# Altium footprint library LimeNet-Micro_2v1.PcbLib: 86 footprints (part 2 of 6)
Each footprint in its own frame and in the unit in brackets; x right, y up, seen from the top. Pads: shape width x height; smd on the part's side, far side on the other; paste and mask are expansions set on the pad; w line width, h text height; cw(c..) or ccw(c..) is an arc to the next point about the centre after c.
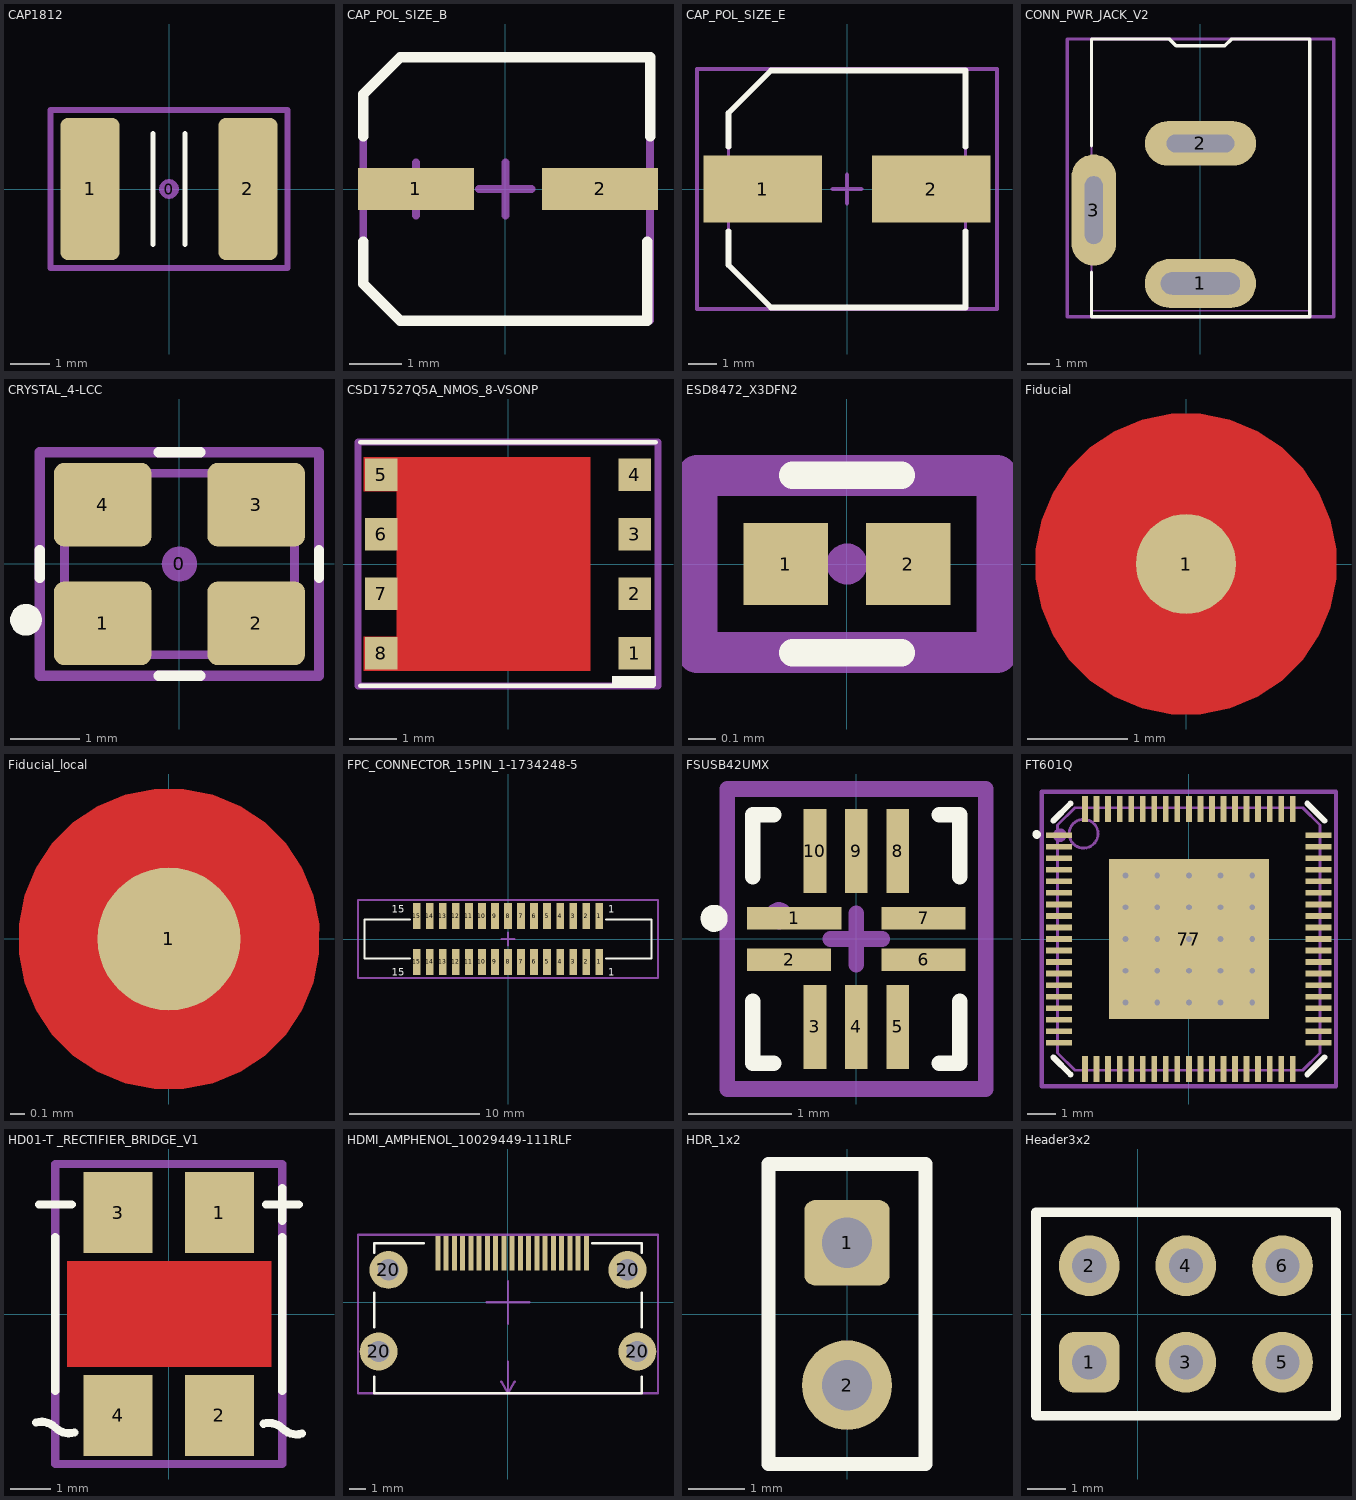
[diagram p1: the footprints below, top view; thin cyan lines are the x and y axes]

## CAP1812 [mm]
pads (3):
  round 0.508 on Mech15: 0(0,0)
  rrect25% 1.5x3.6 smd: 1(-2,0) 2(2,0)
Top Overlay:
  lines w0.127: -0.4,-1.4 -0.4,1.4 ; 0.4,-1.4 0.4,1.4
Mechanical 15:
  lines w0.15: -3,-2 -3,2 3,2 3,-2 -3,-2
  text ".Designator" at -0.65,0.6 h0.55
3D body "C1812C102KGRACTU.step": height 1.54, standoff -0.01, extent -2.4,-1.7 2.4,1.8

## CAP_POL_SIZE_B [mm]
pads (2):
  rect 2.2x0.8 smd: 1(-1.7,0) 2(1.8,0)
Top Overlay:
  lines w0.2: -2.7,-1 -2.7,-1.8 -2,-2.5 2.7,-2.5 2.7,-1 ; -2.7,1 -2.7,1.8 -2,2.5 2.75,2.5 2.75,1
Mechanical 15:
  lines w0.15: -2.2,0 -1.2,0 ; -1.7,-0.5 -1.7,0.5 ; -0.5,0 0.5,0 ; 0,-0.5 0,0.5 ; -2.7,-1.8 -2.7,1.8 -2,2.5 2.75,2.5 2.75,-2.5 -2,-2.5 -2.7,-1.8
  text ".Designator" at -0.741,0.85 h0.55
3D body "猞4 SIZE CODE B.stp": height 5.8, standoff 0, extent -2.5,-2.15 2.5,2.15

## CAP_POL_SIZE_E [mm]
pads (2):
  rect 4.15x2.35 smd: 1(-2.95,0) 2(2.95,0)
Top Overlay:
  lines w0.2: -4.15,-1.475 -4.15,-2.663 -2.663,-4.15 4.15,-4.15 4.15,-1.475 ; -4.15,1.475 -4.15,2.663 -2.663,4.15 4.15,4.15 4.15,1.475
Mechanical 13:
  lines w0.1: -4.15,-2.663 -2.663,-4.15 4.15,-4.15 4.15,4.15 -2.663,4.15 -4.15,2.663 -4.15,-2.663
Mechanical 15:
  lines w0.1: -4.9,0 -3.4,0 ; -4.15,-0.75 -4.15,0.75
  lines w0.15: -0.5,0 0.5,0 ; 0,-0.5 0,0.5 ; -5.25,-4.2 -5.25,4.2 5.25,4.2 5.25,-4.2 -5.25,-4.2
  text ".Designator" at 1.825,-0.98 h0.55
3D body "User Library-capacitor size E.step": height 6.2, standoff -0.01, extent -4.5,-4.15 4.5,4.15

## CONN_PWR_JACK_V2 [mm]
pads (3):
  oval 5x2.2 hole 1 slot 3.56 at 0 deg: 1(0,-14)
  oval 5x2 hole 0.8 slot 3.05 at 0 deg: 2(0,-7.7)
  oval 2x5 hole 0.8 slot 3.05 at 90 deg: 3(-4.8,-10.7)
Top Overlay:
  lines w0.15: -4.9,-13.5 -4.9,-15.5 4.925,-15.5 4.925,-3 1.4,-3 1.1,-3.3 -1.1,-3.3 -1.4,-3 -4.9,-3 -4.9,-7.8
Mechanical 13:
  lines w0.076: -4.9,-12.4 -4.9,-15.225 4.925,-15.225 4.925,-3 1.4,-3 1.1,-3.3 -1.1,-3.3 -1.4,-3 -4.9,-3 -4.9,-9
Mechanical 15:
  lines w0.15: -6,-15.5 -6,-3 6,-3 6,-15.5 -6,-15.5
  text ".Designator" at -0.175,-9.625 h0.55
3D body "3100-522 Connector.stp": height 11, standoff -3.5, extent -4.9,-14.1 4.5,0

## CRYSTAL_4-LCC [mm]
pads (5):
  round 0.508 on Mech15: 0(0,0)
  rrect25% 1.4x1.2 smd: 1(-1.1,-0.85) 2(1.1,-0.85) 3(1.1,0.85) 4(-1.1,0.85)
Top Overlay:
  circle w0.254: c-2.2,-0.8 r0.1
  lines w0.15: -2,-0.2 -2,0.2 ; -0.3,-1.6 0.3,-1.6 ; -0.3,1.6 0.3,1.6 ; 2,-0.2 2,0.2
Mechanical 13:
  lines w0.127: -1.65,-1.143 -1.493,-1.3 1.493,-1.3 1.65,-1.143 1.65,1.144 1.494,1.3 -1.493,1.3 -1.65,1.143 -1.65,-1.143
Mechanical 15:
  circle w0.35: c-1.4,-1.1 r0.141
  lines w0.15: -2,-1.6 2,-1.6 2,1.6 -2,1.6 -2,-1.6
  text ".Designator" at 0.7,1.125 h0.55
3D body "Crystal TXC Corp 7M series.STEP": height 0.8, standoff 0, extent -1.65,-1.3 1.65,1.3

## CSD17527Q5A_NMOS_8-VSONP [mm]
pads (8):
  rect 0.7x0.7 smd: 1(2.705,-1.905) 2(2.705,-0.635) 3(2.705,0.635) 4(2.705,1.905) 5(-2.705,1.905) 6(-2.705,0.635) 7(-2.705,-0.635) 8(-2.705,-1.905)
Top Layer:
  region: -3.075,-1.55 -2.375,-1.55 -2.375,1.55 -3.075,1.55 -3.075,2.275 1.75,2.275 1.75,-2.275 -3.075,-2.275
Top Overlay:
  region: 3.15,-2.6 3.15,-2.4 2.225,-2.4 2.225,-2.6
  lines w0.1: -3.15,-2.6 3.1,-2.6 ; -3.15,2.6 3.15,2.6
Top Paste:
  region: -1.8,1.775 -1.8,0.275 -0.3,0.275 -0.3,1.775
  region: -1.8,-1.775 -1.8,-0.275 -0.3,-0.275 -0.3,-1.775
  region: 0.1,1.775 1.3,1.775 1.3,0.275 0.1,0.275
  region: 0.1,-1.775 1.3,-1.775 1.3,-0.275 0.1,-0.275
Top Solder:
  region: 1.85,-2.35 1.85,2.35 -2.45,2.35 -2.45,-2.35
Mechanical 15:
  circle w0.15: c2.7,-1.9 r0.1
  lines w0.15: -0.5,0 0.5,0 ; 0,-0.5 0,0.5 ; -3.2,-2.6 -3.2,2.6 3.2,2.6 3.2,-2.6 -3.2,-2.6
  text ".Designator" at 0.73,1.345 h0.55
3D body "User Library-VSON-8.step": height 1, standoff 0, extent -3.002,-2.5 3,2.5

## ESD8472_X3DFN2 [mm]
pads (2):
  rect 0.31x0.3 smd mask+0.05: 1(-0.225,0) 2(0.225,0)
Top Overlay:
  lines w0.1: -0.2,-0.325 0.2,-0.325 ; -0.2,0.325 0.2,0.325
Top Solder:
  region: -0.4,0.2 -0.4,-0.2 0.4,-0.2 0.4,0.2
Mechanical 15:
  circle w0.1: c0,0 r0.025
  lines w0.15: -0.55,-0.325 0.55,-0.325 0.55,0.325 -0.55,0.325 -0.55,-0.325
  text ".Designator" at -0.9,0.225 h0.55

## Fiducial [mm]
pads (1):
  round 1 smd paste-1 mask+1: 1(0,0)
Top Layer:
  pour cut-out: 0,1.5 -0.148,1.5 -0.438,1.442 -0.711,1.329 -0.956,1.165 -1.165,0.956 -1.329,0.711 -1.442,0.438 -1.5,0.148 -1.5,0 -1.5,-0.148 -1.442,-0.438 -1.329,-0.711 -1.165,-0.956 -0.956,-1.165 -0.711,-1.329 -0.438,-1.442 -0.148,-1.5 0,-1.5 0.148,-1.5 0.438,-1.442 0.711,-1.329 0.956,-1.165 1.165,-0.956 1.329,-0.711 1.442,-0.438 1.5,-0.148 1.5,0 1.5,0.148 1.442,0.438 1.329,0.711 1.165,0.956 0.956,1.165 0.711,1.329 0.438,1.442 0.148,1.5
Mechanical 1:
  circle w0.6: c0,0 r0.2

## Fiducial_local [mm]
pads (1):
  round 1 smd paste-1 mask+0.5: 1(0,0)
Top Layer:
  pour cut-out: -1.05,0 -1.05,-0.103 -1.01,-0.306 -0.931,-0.497 -0.816,-0.669 -0.669,-0.816 -0.497,-0.931 -0.306,-1.01 -0.103,-1.05 0,-1.05 0.103,-1.05 0.306,-1.01 0.497,-0.931 0.669,-0.816 0.816,-0.669 0.931,-0.497 1.01,-0.306 1.05,-0.103 1.05,0 1.05,0.103 1.01,0.306 0.931,0.497 0.816,0.669 0.669,0.816 0.497,0.931 0.306,1.01 0.103,1.05 0,1.05 -0.103,1.05 -0.306,1.01 -0.497,0.931 -0.669,0.816 -0.816,0.669 -0.931,0.497 -1.01,0.306 -1.05,0.103
Mechanical 1:
  circle w0.6: c0,0 r0.2

## FPC_CONNECTOR_15PIN_1-1734248-5 [mm]
pads (30):
  rect 0.6x2 smd mask+0.05: 1(7,-1.75) 1(7,1.75) 2(6,-1.75) 2(6,1.75) 3(5,-1.75) 3(5,1.75) 4(4,-1.75) 4(4,1.75) 5(3,-1.75) 5(3,1.75) 6(2,-1.75) 6(2,1.75) 7(1,-1.75) 7(1,1.75) 8(0,-1.75) 8(0,1.75) 9(-1,-1.75) 9(-1,1.75) 10(-2,-1.75) 10(-2,1.75) 11(-3,-1.75) 11(-3,1.75) 12(-4,-1.75) 12(-4,1.75) 13(-5,-1.75) 13(-5,1.75) 14(-6,-1.75) 14(-6,1.75) 15(-7,-1.75) 15(-7,1.75)
Top Overlay:
  lines w0.15: -7.5,-1.5 -11,-1.5 -11,1.5 -7.5,1.5 ; 7.5,-1.5 11,-1.5 11,1.5 7.5,1.5
  text "15" at -8.9,-2.8 h0.55
  text "1" at 7.7,2 h0.55
  text "15" at -8.9,2 h0.55
  text "1" at 7.7,-2.8 h0.55
Mechanical 15:
  lines w0.15: -0.5,0 0.5,0 ; 0,-0.5 0,0.5 ; -11.5,-3 -11.5,3 11.5,3 11.5,-3 -11.5,-3
  text "15" at -8.5,-2 h0.55
  text "1" at 7.5,-2 h0.55
  text "15" at -8.5,1.5 h0.55
  text ".Designator" at 0.25,0.125 h0.55
  text "1" at 7.5,1.5 h0.55
3D body "c-1-1734248-5-e-3d.stp": height 5.68, standoff 0, extent -11.2,-2.45 11.2,2.4

## FSUSB42UMX [mm]
pads (10):
  rect 0.91x0.22 smd mask+0.1: 1(-0.6,0.2)
  rect 0.81x0.22 smd mask+0.1: 2(-0.65,-0.2) 6(0.65,-0.2) 7(0.65,0.2)
  rect 0.22x0.81 smd mask+0.1: 3(-0.4,-0.85) 4(0,-0.85) 5(0.4,-0.85) 8(0.4,0.85) 9(0,0.85) 10(-0.4,0.85)
Top Overlay:
  circle w0.15: c-1.375,0.2 r0.056
  lines w0.15: -1,-0.6 -1,-1.2 -0.8,-1.2 ; -1,0.6 -1,1.2 -0.8,1.2 ; 0.8,-1.2 1,-1.2 1,-0.6 ; 0.8,1.2 1,1.2 1,0.6
Mechanical 15:
  circle w0.15: c-0.75,0.225 r0.056
  lines w0.15: -0.25,0 0,0 ; 0,-0.25 0,0 ; 0,0.25 0,0 ; 0.25,0 0,0 ; -1.25,-1.45 -1.25,1.45 1.25,1.45 1.25,-1.45 -1.25,-1.45
  text ".Designator" at -2.238,0.725 h0.55
3D body: height 0.5, standoff 0, extent -0.7,-0.9 0.7,0.9
3D body: height 0.51, standoff 0.5, extent -0.499,0.5 -0.3,0.7

## FT601Q [mm]
pads (77):
  rect 0.9x0.2 smd mask+0.05: 1(-4.5,3.6) 2(-4.5,3.2) 3(-4.5,2.8) 4(-4.5,2.4) 5(-4.5,2) 6(-4.5,1.6) 7(-4.5,1.2) 8(-4.5,0.8) 9(-4.5,0.4) 10(-4.5,0) 11(-4.5,-0.4) 12(-4.5,-0.8) 13(-4.5,-1.2) 14(-4.5,-1.6) 15(-4.5,-2) 16(-4.5,-2.4) 17(-4.5,-2.8) 18(-4.5,-3.2) 19(-4.5,-3.6) 39(4.5,-3.6) 40(4.5,-3.2) 41(4.5,-2.8) 42(4.5,-2.4) 43(4.5,-2) 44(4.5,-1.6) 45(4.5,-1.2) 46(4.5,-0.8) 47(4.5,-0.4) 48(4.5,0) 49(4.5,0.4) 50(4.5,0.8) 51(4.5,1.2) 52(4.5,1.6) 53(4.5,2) 54(4.5,2.4) 55(4.5,2.8) 56(4.5,3.2) 57(4.5,3.6)
  rect 0.2x0.9 smd mask+0.05: 20(-3.6,-4.5) 21(-3.2,-4.5) 22(-2.8,-4.5) 23(-2.4,-4.5) 24(-2,-4.5) 25(-1.6,-4.5) 26(-1.2,-4.5) 27(-0.8,-4.5) 28(-0.4,-4.5) 29(0,-4.5) 30(0.4,-4.5) 31(0.8,-4.5) 32(1.2,-4.5) 33(1.6,-4.5) 34(2,-4.5) 35(2.4,-4.5) 36(2.8,-4.5) 37(3.2,-4.5) 38(3.6,-4.5) 58(3.6,4.5) 59(3.2,4.5) 60(2.8,4.5) 61(2.4,4.5) 62(2,4.5) 63(1.6,4.5) 64(1.2,4.5) 65(0.8,4.5) 66(0.4,4.5) 67(0,4.5) 68(-0.4,4.5) 69(-0.8,4.5) 70(-1.2,4.5) 71(-1.6,4.5) 72(-2,4.5) 73(-2.4,4.5) 74(-2.8,4.5) 75(-3.2,4.5) 76(-3.6,4.5)
  rect 5.55x5.55 smd: 77(0,0)
via 2.2,-2.2 diameter 0.5 hole 0.2
via 1.1,-2.2 diameter 0.5 hole 0.2
via 0,-2.2 diameter 0.5 hole 0.2
via -1.1,-2.2 diameter 0.5 hole 0.2
via -2.2,-2.2 diameter 0.5 hole 0.2
via 2.2,-1.1 diameter 0.5 hole 0.2
via 1.1,-1.1 diameter 0.5 hole 0.2
via 0,-1.1 diameter 0.5 hole 0.2
via -1.1,-1.1 diameter 0.5 hole 0.2
via -2.2,-1.1 diameter 0.5 hole 0.2
via 2.2,0 diameter 0.5 hole 0.2
via 1.1,0 diameter 0.5 hole 0.2
via 0,0 diameter 0.5 hole 0.2
via -1.1,0 diameter 0.5 hole 0.2
via -2.2,0 diameter 0.5 hole 0.2
via 2.2,1.1 diameter 0.5 hole 0.2
via 1.1,1.1 diameter 0.5 hole 0.2
via 0,1.1 diameter 0.5 hole 0.2
via -1.1,1.1 diameter 0.5 hole 0.2
via -2.2,1.1 diameter 0.5 hole 0.2
via 2.2,2.2 diameter 0.5 hole 0.2
via 1.1,2.2 diameter 0.5 hole 0.2
via 0,2.2 diameter 0.5 hole 0.2
via -1.1,2.2 diameter 0.5 hole 0.2
via -2.2,2.2 diameter 0.5 hole 0.2
Top Overlay:
  circle w0.25: c-5.275,3.625 r0.025
  lines w0.2: -4.7,-4.1 -4.1,-4.7 ; -4.7,4.1 -4.1,4.7 ; 4.1,-4.7 4.7,-4.1 ; 4.1,4.7 4.7,4.1
Mechanical 13:
  circle w0.1: c-3.65,3.65 r0.5
  lines w0.1: -4.55,-3.95 -4.55,3.95 -3.95,4.55 3.95,4.55 4.55,3.95 4.55,-3.95 3.95,-4.55 -3.95,-4.55 -4.55,-3.95
Mechanical 15:
  circle w0.4: c-4.475,3.6 r0.035
  lines w0.15: -0.5,0 0.5,0 ; 0,-0.5 0,0.5 ; -5.1,-5.1 5.1,-5.1 5.1,5.1 -5.1,5.1 -5.1,-5.1
  text ".Designator" at 0.989,1.3 h0.55
3D body "FT601Q_1.step": height 1, standoff 0, extent -4.56,-4.56 4.56,4.56

## HD01-T _RECTIFIER_BRIDGE_V1 [mm]
pads (4):
  rect 1.7x2 smd mask+0.05: 1(1.25,2.5) 2(1.25,-2.5) 3(-1.25,2.5) 4(-1.25,-2.5)
Top Layer:
  pour cut-out: -2.5,-1.3 -2.5,1.3 2.525,1.3 2.525,-1.3
Top Overlay:
  lines w0.2: -3.277,-2.678 cw(c-3.141,-3.141) -2.8,-2.8 ccw(c-2.459,-2.459) -2.323,-2.922 ; -3.2,2.7 -2.392,2.7 ; -2.8,-1.9 -2.8,0 -2.8,1.9 ; 2.335,-2.707 cw(c2.471,-3.171) 2.812,-2.829 ccw(c3.154,-2.488) 3.289,-2.951 ; 2.4,2.7 3.208,2.7 ; 2.8,-1.9 2.8,0 2.8,1.9 ; 2.8,2.3 2.8,3.108
Mechanical 15:
  lines w0.2: -1.958,-2.575 cw(c-1.616,-2.916) -1.616,-2.434 cw(c-1.616,-2.916) -1.275,-2.575 ccw(c-0.934,-2.234) -0.934,-2.716 ccw(c-0.934,-2.234) -0.592,-2.575 ; -1.8,2.5 -0.8,2.5 ; -1,0 1,0 ; 0,-1 0,1 ; 0.542,-2.575 cw(c0.884,-2.916) 0.884,-2.434 cw(c0.884,-2.916) 1.225,-2.575 ccw(c1.566,-2.234) 1.566,-2.716 ccw(c1.566,-2.234) 1.908,-2.575 ; 0.75,2.5 1.75,2.5 ; 1.25,2 1.25,3 ; -2.8,-3.7 -2.8,3.7 2.8,3.7 2.8,-3.7 -2.8,-3.7
  text ".Designator" at 1.4,0.55 h0.55
3D body "User Library-DFXXSv2.step": height 2.76, standoff 0.97, extent -2.136,-2.575 2.119,2.575

## HDMI_AMPHENOL_10029449-111RLF [mm]
pads (23):
  rect 0.3x2.1 smd mask+0.05: 1(4.75,2.975) 2(4.25,2.975) 3(3.75,2.975) 4(3.25,2.975) 5(2.75,2.975) 6(2.25,2.975) 7(1.75,2.975) 8(1.25,2.975) 9(0.75,2.975) 10(0.25,2.975) 11(-0.25,2.975) 12(-0.75,2.975) 13(-1.25,2.975) 14(-1.75,2.975) 15(-2.25,2.975) 16(-2.75,2.975) 17(-3.25,2.975) 18(-3.75,2.975) 19(-4.25,2.975)
  round 2.3 hole 1.3 mask+0.05: 20(-7.85,-2.975) 20(-7.25,1.975) 20(7.25,1.975) 20(7.85,-2.975)
Top Overlay:
  lines w0.15: -8.1,-4.5 -8.1,-5.5 8.1,-5.5 8.1,-4.5 ; -8.1,-1.5 -8.1,0.6 ; -8.1,3 -8.1,3.6 -5.1,3.6 ; 5.1,3.6 8.1,3.6 8.1,3 ; 8.1,-1.5 8.1,0.6
Mechanical 15:
  lines w0.15: -1.3,0 0,0 ; -0.4,-4.8 0,-5.5 ; 0,-3.6 0,-5.5 ; 0,-1.3 0,0 ; 0,1.3 0,0 ; 0.4,-4.8 0,-5.5 ; 1.3,0 0,0 ; -9.1,-5.5 -9.1,4.1 9.1,4.1 9.1,-5.5 -9.1,-5.5
  text ".Designator" at 0.85,2.425 h0.55
  text "19" at -4.45,2.25 h0.55
  text "PCB edge" at 1.975,-2.575 h0.55
  text "1" at 4.925,2.325 h0.55
3D body "10029449-111RLF.stp": height 6.26, standoff -1.88, extent -8.1,-6.5 8.1,3.6

## HDR_1x2 [mm]
pads (2):
  rrect25% 1.524x1.524 hole 0.9: 1(0,1.27)
  round 1.6 hole 0.9: 2(0,-1.27)
Top Overlay:
  lines w0.254: -1.4,-2.675 1.4,-2.675 1.4,2.675 -1.4,2.675 -1.4,-2.675
Mechanical 15:
  lines w0.15: -1.4,-2.675 1.4,-2.675 1.4,2.675 -1.4,2.675 -1.4,-2.675
  text ".Designator" at 0.35,-0.8 h0.55
3D body "65775.stp": height 8.54, standoff -3, extent -1.27,-2.54 1.27,0
3D body "65775.stp": height 8.54, standoff -3, extent -1.27,0 1.27,2.54

## Header3x2 [mm]
pads (6):
  rrect50% 1.6x1.6 hole 0.9: 1(-1.271,-1.271)
  round 1.6 hole 0.9: 2(-1.271,1.271) 3(1.271,-1.271) 4(1.271,1.271) 5(3.814,-1.271) 6(3.814,1.271)
Top Overlay:
  lines w0.254: -2.675,-2.675 -2.675,2.675 5.225,2.675 5.225,-2.675 -2.675,-2.675
Mechanical 15:
  lines w0.15: -2.675,-2.675 5.225,-2.675 5.225,2.675 -2.675,2.675 -2.675,-2.675
  text ".Designator" at 1.925,0.2 h0.55
3D body "65775.stp": height 8.54, standoff -3, extent -2.541,0.002 -0.001,2.542
3D body "65775.stp": height 8.54, standoff -3, extent 0.001,0.002 2.541,2.542
3D body "65775.stp": height 8.54, standoff -3, extent 2.544,0.002 5.084,2.542
3D body "65775.stp": height 8.54, standoff -3, extent 2.544,-2.541 5.084,-0.001
3D body "65775.stp": height 8.54, standoff -3, extent 0.001,-2.541 2.541,-0.001
3D body "65775.stp": height 8.54, standoff -3, extent -2.541,-2.541 -0.001,-0.001